# Altium footprint library Pasivos.PcbLib: 138 footprints (part 4 of 9)
Each footprint in its own frame and in the unit in brackets; x right, y up, seen from the top. Pads: shape width x height; smd on the part's side, far side on the other; paste and mask are expansions set on the pad; w line width, h text height; cw(c..) or ccw(c..) is an arc to the next point about the centre after c.
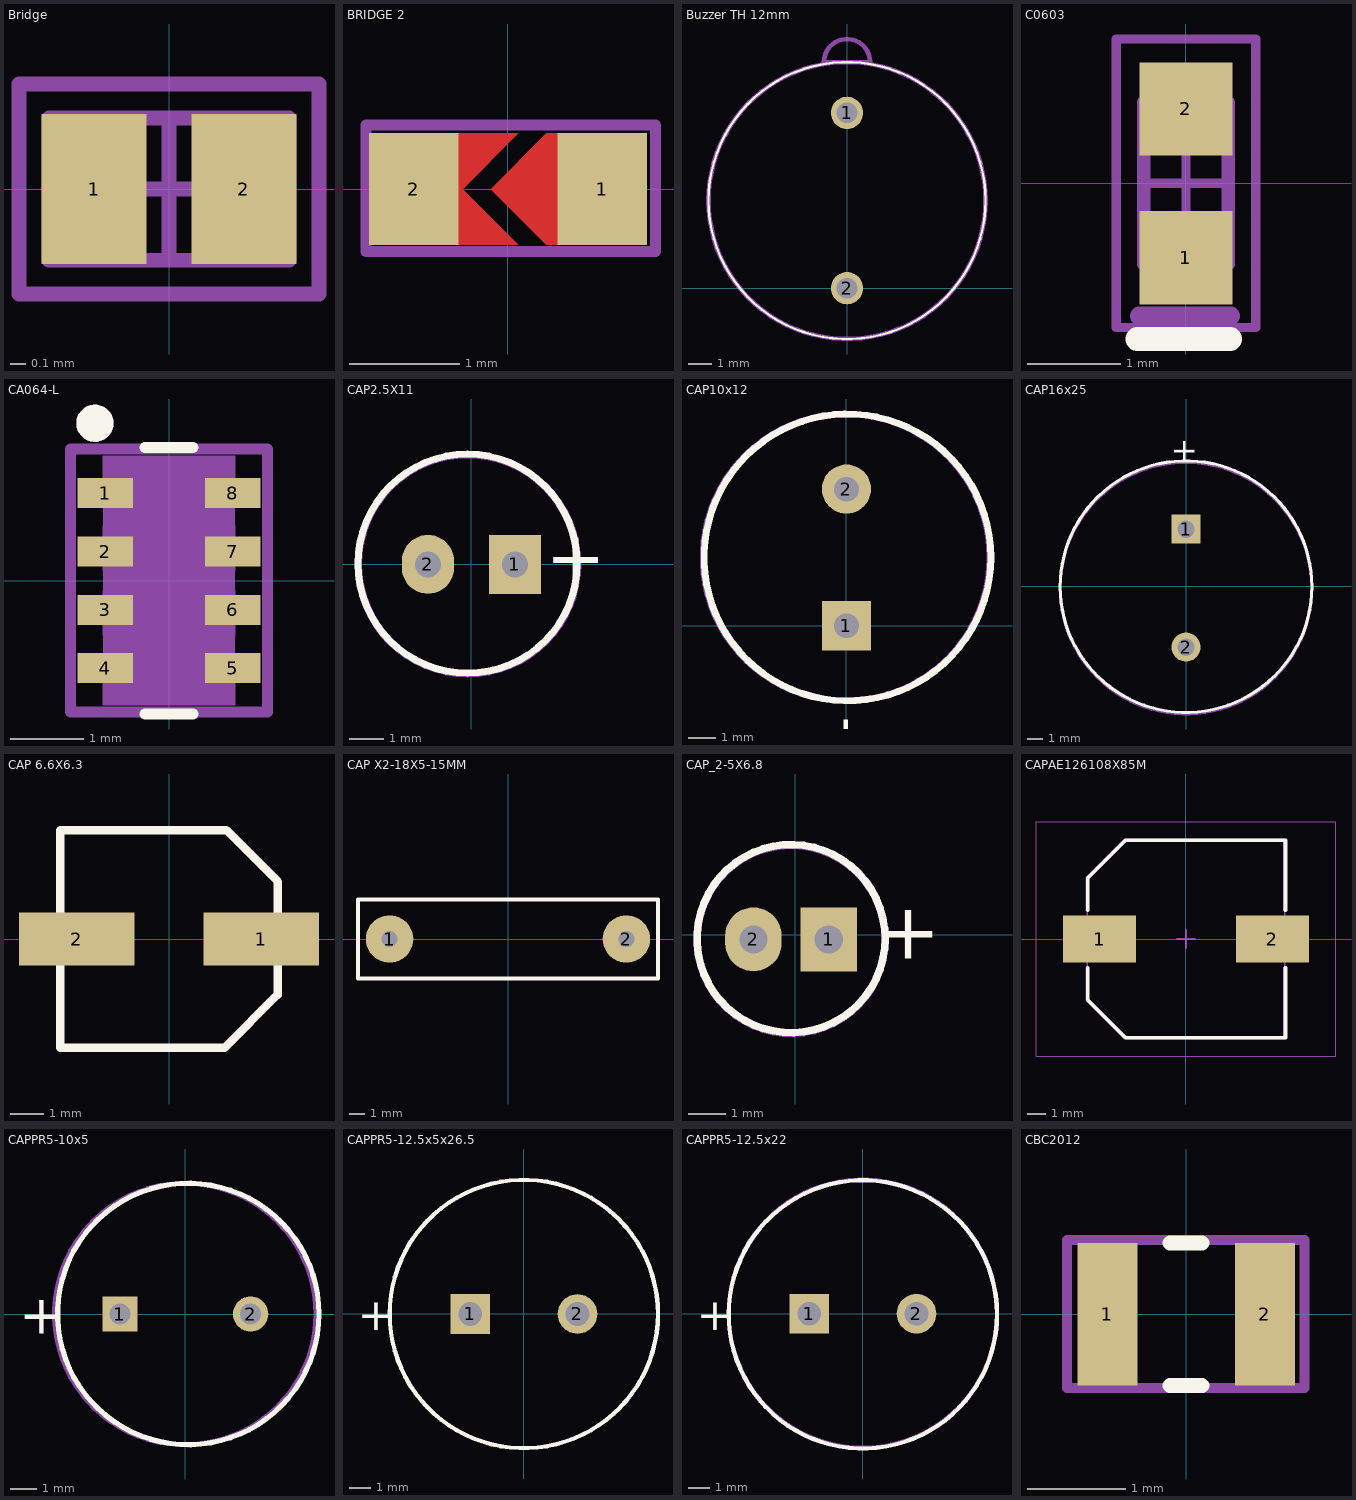
[diagram p3: the footprints below, top view; thin cyan lines are the x and y axes]

## Bridge [mm] "Puente de Estaño"
pads (2):
  rect 0.7x1 smd: 1(-0.5,0) 2(0.5,0)
Mechanical 15:
  lines w0.1: -0.475,0 0.475,0 ; 0,-0.475 0,0.475 ; -1,-0.7 -1,0.7 1,0.7 1,-0.7 -1,-0.7
Mechanical 29:
  lines w0.1: -0.8,-0.475 -0.8,0.475 0.8,0.475 0.8,-0.475 -0.8,-0.475
  text "'.Designator'" at -0.609,-0.289 h0.5

## BRIDGE 2 [mil]
pads (2):
  rect 32x40 smd: 1(33.75,0) 2(-33.75,0)
Top Layer:
  region: -26.25,0 -16.25,0 3.75,-20 -26.25,-20
  region: -26.25,0 -16.25,0 3.75,20 -26.25,20
  region: 23.75,20 13.75,20 -6.25,0 13.75,-20 23.75,-20
Top Paste:
  region: -26.25,0 -16.25,0 3.75,-20 -26.25,-20
  region: -26.25,0 -16.25,0 3.75,20 -26.25,20
  region: 23.75,20 13.75,20 -6.25,0 13.75,-20 23.75,-20
Top Solder:
  region: -26.25,0 -12.25,0 11.75,-24 -26.25,-24
  region: -26.25,0 -12.25,0 11.75,24 -26.25,24
  region: 23.75,24 13.75,24 -10.25,0 13.75,-24 23.75,-24
Mechanical 29:
  lines w3.94: -50.81,-22.46 52.77,-22.46 52.77,22.97 -50.81,22.97 -50.81,-22.46
  text "'.Designator'" at -44.45,-10.02 h19.68

## Buzzer TH 12mm [mm] "TH. 12 mm L x 12 mm W x 9.5 mm H (7.6mm)"
pads (2):
  round 1.4 hole 0.9: 1(0,7.6) 2(0,0)
Top Overlay:
  lines w0.1: -6,3.8 ccw(c0,3.8) 6,3.8 ccw(c0,3.8) -6,3.8
Mechanical 13:
  lines w0.2: -6,3.8 ccw(c0,3.8) 6,3.8 ccw(c0,3.8) -6,3.8 ; -1,9.8 cw(c0,9.8) 1,9.8 -1,9.8
3D body "AI-1223-TWT-12V-3-R.stp": height 9.8, standoff -5, extent -6,-2.2 6,10.8

## C0603 [mm]
pads (2):
  rect 1x1 smd: 1(0,-0.8) 2(0,0.8)
Top Overlay:
  lines w0.254: -0.524,-1.673 0.476,-1.673
Mechanical 13:
  lines w0.1: -0.475,-0.875 -0.475,0.875 0.475,0.875 0.475,-0.875 -0.475,-0.875
Mechanical 15:
  lines w0.1: -0.475,0 0.475,0 ; 0,-0.475 0,0.475 ; -0.75,-1.55 -0.75,1.55 0.75,1.55 0.75,-1.55 -0.75,-1.55
Mechanical 29:
  lines w0.1: -0.431,-1.101 0.429,-1.101 0.429,1.049 -0.431,1.049 -0.431,-1.101
  lines w0.2: -0.501,-1.426 0.479,-1.426
  text "'.Designator'" at 0.252,-0.962 h0.5
3D body "0603 SMD Capacitor.step": height 0.3, standoff 0, extent -0.4,-0.8 0.4,0.8

## CA064-L [mm] "Capacitor Array x 4"
pads (8):
  rect 0.758x0.41 smd paste+0 mask+0: 1(-0.873,1.2) 2(-0.873,0.4) 3(-0.873,-0.4) 4(-0.873,-1.2) 5(0.873,-1.2) 6(0.873,-0.4) 7(0.873,0.4) 8(0.873,1.2)
Top Overlay:
  circle w0.254: c-1.016,2.159 r0.127
  lines w0.152: -0.331,-1.829 0.331,-1.829 ; -0.331,1.829 0.331,1.829
Mechanical 13:
  circle w0.254: c-1.016,2.159 r0.127
  lines w0: -0.902,-1.029 ccw(c-0.902,-0.889) -0.902,-0.749 ; -0.902,-0.14 ccw(c-0.902,0) -0.902,0.14 ; -0.902,0.749 ccw(c-0.902,0.889) -0.902,1.029 ; 0.902,-1.029 cw(c0.902,-0.889) 0.902,-0.749 ; 0.902,-0.14 cw(c0.902,0) 0.902,0.14 ; 0.902,0.749 cw(c0.902,0.889) 0.902,1.029
  lines w0.025: -0.902,-1.029 -0.902,-1.638 -0.902,-1.702 0.902,-1.702 0.902,-1.638 0.902,-1.029 ; -0.902,-0.749 -0.902,-0.14 ; -0.902,0.14 -0.902,0.749 ; -0.902,1.029 -0.902,1.638 -0.902,1.702 0.902,1.702 0.902,1.638 0.902,1.029 ; 0.902,-0.749 0.902,-0.14 ; 0.902,0.14 0.902,0.749
Mechanical 15:
  region: 0.902,-1.702 -0.902,-1.702 -0.902,1.702 0.902,1.702
  lines w0.152: -1.353,-1.803 -1.353,1.803 1.353,1.803 1.353,-1.803 -1.353,-1.803
3D body "Cap_0612_ARRAY.STEP": height 0.72, standoff -0.03, extent -0.858,-1.6 0.762,1.6
3D body: height 0.25, standoff 0, extent 0,0 0.254,0.254

## CAP2.5X11 [mm] "Capacitor x35V"
pads (2):
  rect 1.5x1.7 hole 0.75: 1(1.25,0)
  oval 1.5x1.7 hole 0.75: 2(-1.25,0)
Top Overlay:
  circle w0.2: c-0.111,0.021 r3.15
  text "+" at 3.864,0.771 h1.5
Mechanical 29:
  circle w0.2: c-0.091,0.007 r3.15
  text "+" at 3.884,0.757 h1.5
  text "'.Designator'" at -2.232,-0.202 h0.5
Mechanical 30:
  circle w0.2: c-0.111,0 r3.15
  text "'.Designator'" at -2.251,-0.209 h0.5
  text "+" at 3.864,0.75 h1.5
3D body "Capacitor Electrolytic (Vertical).step": height 11, standoff -2.82, extent -2.627,-2.54 2.373,2.46

## CAP10x12 [mm]
pads (2):
  rect 1.8x1.8 hole 0.9: 1(0,0)
  round 1.8 hole 0.9: 2(0,5)
Top Overlay:
  circle w0.25: c0.038,2.5 r5.25
  text "+" at -0.642,-3.232 h1.5
Mechanical 1:
  circle w0.02: c0,2.5 r5.25
Mechanical 29:
  circle w0.25: c0,2.5 r5.25
  text "+" at -0.68,-3.232 h1.5
  text "'.Designator'" at -0.116,2.18 h0.5
3D body "CAP10X12.step": height 13.03, standoff -3.48, extent -5.08,-2.525 4.971,7.525

## CAP16x25 [mm]
pads (2):
  rect 1.85x1.85 hole 1.1: 1(0,3.623)
  round 1.85 hole 1.1: 2(0,-3.877)
Top Overlay:
  circle w0.2: c0,-0.028 r8
  text "+" at -0.75,9.447 h1.5
Mechanical 29:
  circle w0.2: c0,-0.127 r8
  text "+" at -0.75,9.348 h1.5
  text "'.Designator'" at -0.361,-0.024 h0.5
3D body "CAP16x25.STEP": height 25.2, standoff -4.5, extent -8,-8.126 8,7.874

## CAP 6.6X6.3 [mm]
pads (2):
  rect 3.5x1.6 smd: 1(2.8,0) 2(-2.8,0)
Top Overlay:
  lines w0.254: 3.281,-1.705 1.686,-3.3 -3.3,-3.3 -3.3,3.3 1.738,3.3 3.3,1.738 3.3,-1.7
3D body "User Library-ALU-D8.STEP": height 7.7, standoff 0, extent -3.509,-3.309 3.491,3.291

## CAP X2-18X5-15MM [mm]
height 10.5
pads (2):
  round 3 hole 1: 1(-7.5,0) 2(7.5,0)
Top Overlay:
  lines w0.254: -9.5,-2.5 -9.5,2.5 9.5,2.5 9.5,-2.5 -9.5,-2.5
3D body "User Library-CAP POLY  17_5 x 5mm x 11mm.step": height 11, standoff -3.5, extent -8.75,-2.54 8.75,2.46

## CAP_2-5X6.8 [mm] "Capacitor x16V"
pads (2):
  rect 1.5x1.7 hole 0.75: 1(0.889,-0.127)
  oval 1.5x1.7 hole 0.75: 2(-1.111,-0.127)
Top Overlay:
  circle w0.2: c-0.111,-0.106 r2.5
  text "+" at 3.864,0.644 h1.5
Mechanical 29:
  circle w0.2: c-0.111,-0.127 r2.5
  text "'.Designator'" at -2.251,-0.336 h0.5
  text "+" at 3.864,0.623 h1.5
3D body "Capacitor Electrolytic (Vertical).step": height 11, standoff -2.82, extent -2.627,-2.667 2.373,2.333

## CAPAE126108X85M [mm] "Aluminum Electrolytic Capacitor, Body 10,80x10,80x8,50mm, IPC Low Density"
height 8.5
pads (2):
  rect 4x2.55 smd: 1(-4.725,0) 2(4.725,0)
Top Overlay:
  lines w0.2: -5.364,-1.575 -5.364,-3.337 -3.302,-5.4 5.436,-5.4 5.436,-1.575 ; -5.364,1.575 -5.364,3.338 -3.302,5.4 5.436,5.4 5.436,1.575
Mechanical 13:
  lines w0.1: -5.4,-3.337 -5.4,3.338 -3.337,5.4 5.4,5.4 5.4,-5.4 -3.337,-5.4 -5.4,-3.337
Mechanical 15:
  lines w0.05: -8.2,-6.4 8.2,-6.4 8.2,6.4 -8.2,6.4 -8.2,-6.4
  lines w0.1: -0.5,0 0.5,0 ; 0,-0.5 0,0.5
Mechanical 29:
  lines w0.2: -5.4,-1.575 -5.4,-3.337 -3.337,-5.4 5.4,-5.4 5.4,-1.575 ; -5.4,1.575 -5.4,3.338 -3.337,5.4 5.4,5.4 5.4,1.575
  text "'.Designator'" at -0.949,-0.277 h0.5
3D body "cap_10x10x10-1.STEP": height 10.3, standoff -0.2, extent -5.791,-5.26 6.009,5.24

## CAPPR5-10x5 [mm] "Capacitor, Electrolytic, Radial; Body 10 x 5 mm (Dia.xH typ); Pin Spacing 5 mm (typ)"
height 6
pads (2):
  rect 1.35x1.35 hole 0.8: 1(-2.5,0)
  round 1.35 hole 0.8: 2(2.5,0)
Top Overlay:
  circle w0.2: c0.114,0 r5
  text "+" at -6.361,-0.75 h1.5
Mechanical 29:
  circle w0.2: c0,0 r5
  text "'.Designator'" at -0.347,-0.054 h0.5
  text "+" at -6.475,-0.75 h1.5
3D body "ELECTROLITIC CAPACITOR RADIAL 10X12.step": height 2, standoff -12.5, extent -5.03,-4.98 4.97,5.02

## CAPPR5-12.5x5x26.5 [mm] "Capacitor, Electrolytic, Radial; Body 12.5 x 22 mm (Dia.xH typ); Pin Spacing 5 mm (typ)"
height 26.5
pads (2):
  rect 1.85x1.85 hole 1.1: 1(-2.5,0)
  round 1.85 hole 1.1: 2(2.5,0)
Top Overlay:
  circle w0.2: c0,0 r6.25
  text "+" at -7.725,-0.75 h1.5
3D body "User Library-CAPAER_D125_L265_P050_W006X030.STEP": height 26.52, standoff -3, extent -6.21,-6.24 6.3,6.26

## CAPPR5-12.5x22 [mm] "Capacitor, Electrolytic, Radial; Body 12.5 x 22 mm (Dia.xH typ); Pin Spacing 5 mm (typ)"
height 23
pads (2):
  rect 1.85x1.85 hole 1.1: 1(-2.5,0)
  round 1.85 hole 1.1: 2(2.5,0)
Top Overlay:
  circle w0.2: c0,-0.036 r6.25
  text "+" at -7.725,-0.786 h1.5
Mechanical 29:
  circle w0.2: c0,0 r6.25
  text "+" at -7.725,-0.75 h1.5
  text "'.Designator'" at -0.379,-0.065 h0.5
3D body "CAPPR5-12.5x22.step": height 20.01, standoff -2.7, extent -6.223,-6.223 6.233,6.277

## CBC2012 [mil]
pads (2):
  rect 24x57 smd: 1(-31.5,0) 2(31.5,0)
Top Overlay:
  lines w6: -6.4,-28.5 6.4,-28.5 ; -6.4,28.5 6.4,28.5
Mechanical 29:
  lines w3.94: -47.61,-29.58 -47.61,29.66 47.37,29.66 47.37,-29.58 -47.61,-29.58
  text "'.Designator'" at -39.24,-8.33 h19.68